# Altium footprint library ST封装.PcbLib: 1336 footprints (part 82 of 109)
Each footprint in its own frame and in the unit in brackets; x right, y up, seen from the top. Pads: shape width x height; smd on the part's side, far side on the other; paste and mask are expansions set on the pad; w line width, h text height; cw(c..) or ccw(c..) is an arc to the next point about the centre after c.
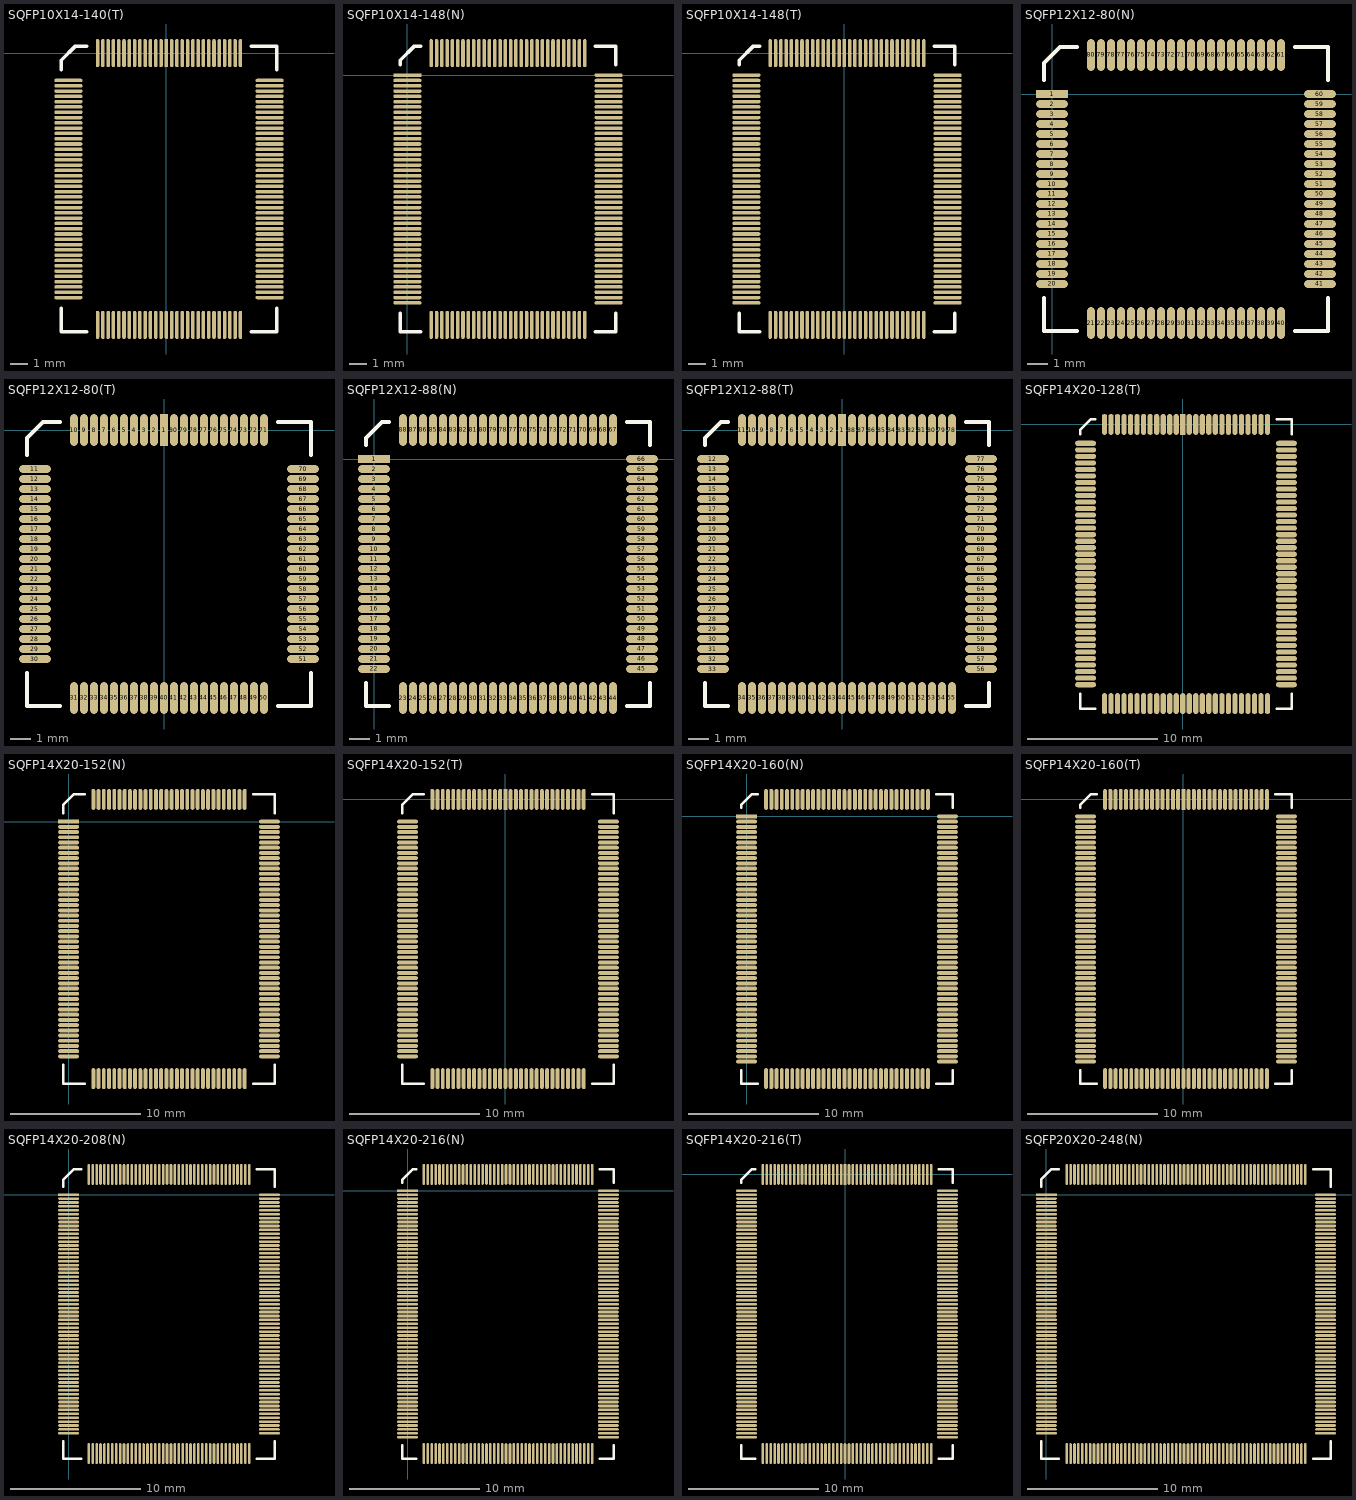
[diagram p81: the footprints below, top view; thin cyan lines are the x and y axes]

## SQFP10X14-140(T) [mm]
pads (140):
  rect 0.2x1.6 smd: 1(0,0)
  oval 0.2x1.6 smd: 2(-0.3,0) 3(-0.6,0) 4(-0.9,0) 5(-1.2,0) 6(-1.5,0) 7(-1.8,0) 8(-2.1,0) 9(-2.4,0) 10(-2.7,0) 11(-3,0) 12(-3.3,0) 13(-3.6,0) 14(-3.9,0) 57(-3.9,-15.4) 58(-3.6,-15.4) 59(-3.3,-15.4) 60(-3,-15.4) 61(-2.7,-15.4) 62(-2.4,-15.4) 63(-2.1,-15.4) 64(-1.8,-15.4) 65(-1.5,-15.4) 66(-1.2,-15.4) 67(-0.9,-15.4) 68(-0.6,-15.4) 69(-0.3,-15.4) 70(0,-15.4) 71(0.3,-15.4) 72(0.6,-15.4) 73(0.9,-15.4) 74(1.2,-15.4) 75(1.5,-15.4) 76(1.8,-15.4) 77(2.1,-15.4) 78(2.4,-15.4) 79(2.7,-15.4) 80(3,-15.4) 81(3.3,-15.4) 82(3.6,-15.4) 83(3.9,-15.4) 84(4.2,-15.4) 127(4.2,0) 128(3.9,0) 129(3.6,0) 130(3.3,0) 131(3,0) 132(2.7,0) 133(2.4,0) 134(2.1,0) 135(1.8,0) 136(1.5,0) 137(1.2,0) 138(0.9,0) 139(0.6,0) 140(0.3,0)
  oval 1.6x0.2 smd: 15(-5.55,-1.55) 16(-5.55,-1.85) 17(-5.55,-2.15) 18(-5.55,-2.45) 19(-5.55,-2.75) 20(-5.55,-3.05) 21(-5.55,-3.35) 22(-5.55,-3.65) 23(-5.55,-3.95) 24(-5.55,-4.25) 25(-5.55,-4.55) 26(-5.55,-4.85) 27(-5.55,-5.15) 28(-5.55,-5.45) 29(-5.55,-5.75) 30(-5.55,-6.05) 31(-5.55,-6.35) 32(-5.55,-6.65) 33(-5.55,-6.95) 34(-5.55,-7.25) 35(-5.55,-7.55) 36(-5.55,-7.85) 37(-5.55,-8.15) 38(-5.55,-8.45) 39(-5.55,-8.75) 40(-5.55,-9.05) 41(-5.55,-9.35) 42(-5.55,-9.65) 43(-5.55,-9.95) 44(-5.55,-10.25) 45(-5.55,-10.55) 46(-5.55,-10.85) 47(-5.55,-11.15) 48(-5.55,-11.45) 49(-5.55,-11.75) 50(-5.55,-12.05) 51(-5.55,-12.35) 52(-5.55,-12.65) 53(-5.55,-12.95) 54(-5.55,-13.25) 55(-5.55,-13.55) 56(-5.55,-13.85) 85(5.85,-13.85) 86(5.85,-13.55) 87(5.85,-13.25) 88(5.85,-12.95) 89(5.85,-12.65) 90(5.85,-12.35) 91(5.85,-12.05) 92(5.85,-11.75) 93(5.85,-11.45) 94(5.85,-11.15) 95(5.85,-10.85) 96(5.85,-10.55) 97(5.85,-10.25) 98(5.85,-9.95) 99(5.85,-9.65) 100(5.85,-9.35) 101(5.85,-9.05) 102(5.85,-8.75) 103(5.85,-8.45) 104(5.85,-8.15) 105(5.85,-7.85) 106(5.85,-7.55) 107(5.85,-7.25) 108(5.85,-6.95) 109(5.85,-6.65) 110(5.85,-6.35) 111(5.85,-6.05) 112(5.85,-5.75) 113(5.85,-5.45) 114(5.85,-5.15) 115(5.85,-4.85) 116(5.85,-4.55) 117(5.85,-4.25) 118(5.85,-3.95) 119(5.85,-3.65) 120(5.85,-3.35) 121(5.85,-3.05) 122(5.85,-2.75) 123(5.85,-2.45) 124(5.85,-2.15) 125(5.85,-1.85) 126(5.85,-1.55)
Top Overlay:
  lines w0.2: -5.95,-14.45 -5.95,-15.8 -4.5,-15.8 ; -5.95,-0.95 -5.95,-0.4 -5.15,0.4 -4.5,0.4 ; 4.8,-15.8 6.25,-15.8 6.25,-14.45 ; 4.8,0.4 6.25,0.4 6.25,-0.95

## SQFP10X14-148(N) [mm]
pads (148):
  rect 1.6x0.2 smd: 1(0,0)
  oval 1.6x0.2 smd: 2(0,-0.3) 3(0,-0.6) 4(0,-0.9) 5(0,-1.2) 6(0,-1.5) 7(0,-1.8) 8(0,-2.1) 9(0,-2.4) 10(0,-2.7) 11(0,-3) 12(0,-3.3) 13(0,-3.6) 14(0,-3.9) 15(0,-4.2) 16(0,-4.5) 17(0,-4.8) 18(0,-5.1) 19(0,-5.4) 20(0,-5.7) 21(0,-6) 22(0,-6.3) 23(0,-6.6) 24(0,-6.9) 25(0,-7.2) 26(0,-7.5) 27(0,-7.8) 28(0,-8.1) 29(0,-8.4) 30(0,-8.7) 31(0,-9) 32(0,-9.3) 33(0,-9.6) 34(0,-9.9) 35(0,-10.2) 36(0,-10.5) 37(0,-10.8) 38(0,-11.1) 39(0,-11.4) 40(0,-11.7) 41(0,-12) 42(0,-12.3) 43(0,-12.6) 44(0,-12.9) 75(11.4,-12.9) 76(11.4,-12.6) 77(11.4,-12.3) 78(11.4,-12) 79(11.4,-11.7) 80(11.4,-11.4) 81(11.4,-11.1) 82(11.4,-10.8) 83(11.4,-10.5) 84(11.4,-10.2) 85(11.4,-9.9) 86(11.4,-9.6) 87(11.4,-9.3) 88(11.4,-9) 89(11.4,-8.7) 90(11.4,-8.4) 91(11.4,-8.1) 92(11.4,-7.8) 93(11.4,-7.5) 94(11.4,-7.2) 95(11.4,-6.9) 96(11.4,-6.6) 97(11.4,-6.3) 98(11.4,-6) 99(11.4,-5.7) 100(11.4,-5.4) 101(11.4,-5.1) 102(11.4,-4.8) 103(11.4,-4.5) 104(11.4,-4.2) 105(11.4,-3.9) 106(11.4,-3.6) 107(11.4,-3.3) 108(11.4,-3) 109(11.4,-2.7) 110(11.4,-2.4) 111(11.4,-2.1) 112(11.4,-1.8) 113(11.4,-1.5) 114(11.4,-1.2) 115(11.4,-0.9) 116(11.4,-0.6) 117(11.4,-0.3) 118(11.4,0)
  oval 0.2x1.6 smd: 45(1.35,-14.15) 46(1.65,-14.15) 47(1.95,-14.15) 48(2.25,-14.15) 49(2.55,-14.15) 50(2.85,-14.15) 51(3.15,-14.15) 52(3.45,-14.15) 53(3.75,-14.15) 54(4.05,-14.15) 55(4.35,-14.15) 56(4.65,-14.15) 57(4.95,-14.15) 58(5.25,-14.15) 59(5.55,-14.15) 60(5.85,-14.15) 61(6.15,-14.15) 62(6.45,-14.15) 63(6.75,-14.15) 64(7.05,-14.15) 65(7.35,-14.15) 66(7.65,-14.15) 67(7.95,-14.15) 68(8.25,-14.15) 69(8.55,-14.15) 70(8.85,-14.15) 71(9.15,-14.15) 72(9.45,-14.15) 73(9.75,-14.15) 74(10.05,-14.15) 119(10.05,1.25) 120(9.75,1.25) 121(9.45,1.25) 122(9.15,1.25) 123(8.85,1.25) 124(8.55,1.25) 125(8.25,1.25) 126(7.95,1.25) 127(7.65,1.25) 128(7.35,1.25) 129(7.05,1.25) 130(6.75,1.25) 131(6.45,1.25) 132(6.15,1.25) 133(5.85,1.25) 134(5.55,1.25) 135(5.25,1.25) 136(4.95,1.25) 137(4.65,1.25) 138(4.35,1.25) 139(4.05,1.25) 140(3.75,1.25) 141(3.45,1.25) 142(3.15,1.25) 143(2.85,1.25) 144(2.55,1.25) 145(2.25,1.25) 146(1.95,1.25) 147(1.65,1.25) 148(1.35,1.25)
Top Overlay:
  lines w0.2: -0.4,-13.5 -0.4,-14.55 0.75,-14.55 ; -0.4,0.6 -0.4,0.85 0.4,1.65 0.75,1.65 ; 10.65,-14.55 11.8,-14.55 11.8,-13.5 ; 10.65,1.65 11.8,1.65 11.8,0.6

## SQFP10X14-148(T) [mm]
pads (148):
  rect 0.2x1.6 smd: 1(0,0)
  oval 0.2x1.6 smd: 2(-0.3,0) 3(-0.6,0) 4(-0.9,0) 5(-1.2,0) 6(-1.5,0) 7(-1.8,0) 8(-2.1,0) 9(-2.4,0) 10(-2.7,0) 11(-3,0) 12(-3.3,0) 13(-3.6,0) 14(-3.9,0) 15(-4.2,0) 60(-4.2,-15.4) 61(-3.9,-15.4) 62(-3.6,-15.4) 63(-3.3,-15.4) 64(-3,-15.4) 65(-2.7,-15.4) 66(-2.4,-15.4) 67(-2.1,-15.4) 68(-1.8,-15.4) 69(-1.5,-15.4) 70(-1.2,-15.4) 71(-0.9,-15.4) 72(-0.6,-15.4) 73(-0.3,-15.4) 74(0,-15.4) 75(0.3,-15.4) 76(0.6,-15.4) 77(0.9,-15.4) 78(1.2,-15.4) 79(1.5,-15.4) 80(1.8,-15.4) 81(2.1,-15.4) 82(2.4,-15.4) 83(2.7,-15.4) 84(3,-15.4) 85(3.3,-15.4) 86(3.6,-15.4) 87(3.9,-15.4) 88(4.2,-15.4) 89(4.5,-15.4) 134(4.5,0) 135(4.2,0) 136(3.9,0) 137(3.6,0) 138(3.3,0) 139(3,0) 140(2.7,0) 141(2.4,0) 142(2.1,0) 143(1.8,0) 144(1.5,0) 145(1.2,0) 146(0.9,0) 147(0.6,0) 148(0.3,0)
  oval 1.6x0.2 smd: 16(-5.55,-1.25) 17(-5.55,-1.55) 18(-5.55,-1.85) 19(-5.55,-2.15) 20(-5.55,-2.45) 21(-5.55,-2.75) 22(-5.55,-3.05) 23(-5.55,-3.35) 24(-5.55,-3.65) 25(-5.55,-3.95) 26(-5.55,-4.25) 27(-5.55,-4.55) 28(-5.55,-4.85) 29(-5.55,-5.15) 30(-5.55,-5.45) 31(-5.55,-5.75) 32(-5.55,-6.05) 33(-5.55,-6.35) 34(-5.55,-6.65) 35(-5.55,-6.95) 36(-5.55,-7.25) 37(-5.55,-7.55) 38(-5.55,-7.85) 39(-5.55,-8.15) 40(-5.55,-8.45) 41(-5.55,-8.75) 42(-5.55,-9.05) 43(-5.55,-9.35) 44(-5.55,-9.65) 45(-5.55,-9.95) 46(-5.55,-10.25) 47(-5.55,-10.55) 48(-5.55,-10.85) 49(-5.55,-11.15) 50(-5.55,-11.45) 51(-5.55,-11.75) 52(-5.55,-12.05) 53(-5.55,-12.35) 54(-5.55,-12.65) 55(-5.55,-12.95) 56(-5.55,-13.25) 57(-5.55,-13.55) 58(-5.55,-13.85) 59(-5.55,-14.15) 90(5.85,-14.15) 91(5.85,-13.85) 92(5.85,-13.55) 93(5.85,-13.25) 94(5.85,-12.95) 95(5.85,-12.65) 96(5.85,-12.35) 97(5.85,-12.05) 98(5.85,-11.75) 99(5.85,-11.45) 100(5.85,-11.15) 101(5.85,-10.85) 102(5.85,-10.55) 103(5.85,-10.25) 104(5.85,-9.95) 105(5.85,-9.65) 106(5.85,-9.35) 107(5.85,-9.05) 108(5.85,-8.75) 109(5.85,-8.45) 110(5.85,-8.15) 111(5.85,-7.85) 112(5.85,-7.55) 113(5.85,-7.25) 114(5.85,-6.95) 115(5.85,-6.65) 116(5.85,-6.35) 117(5.85,-6.05) 118(5.85,-5.75) 119(5.85,-5.45) 120(5.85,-5.15) 121(5.85,-4.85) 122(5.85,-4.55) 123(5.85,-4.25) 124(5.85,-3.95) 125(5.85,-3.65) 126(5.85,-3.35) 127(5.85,-3.05) 128(5.85,-2.75) 129(5.85,-2.45) 130(5.85,-2.15) 131(5.85,-1.85) 132(5.85,-1.55) 133(5.85,-1.25)
Top Overlay:
  lines w0.2: -5.95,-14.75 -5.95,-15.8 -4.8,-15.8 ; -5.95,-0.65 -5.95,-0.4 -5.15,0.4 -4.8,0.4 ; 5.1,-15.8 6.25,-15.8 6.25,-14.75 ; 5.1,0.4 6.25,0.4 6.25,-0.65

## SQFP12X12-80(N) [mm]
pads (80):
  rect 1.6x0.4 smd: 1(0,0)
  oval 1.6x0.4 smd: 2(0,-0.5) 3(0,-1) 4(0,-1.5) 5(0,-2) 6(0,-2.5) 7(0,-3) 8(0,-3.5) 9(0,-4) 10(0,-4.5) 11(0,-5) 12(0,-5.5) 13(0,-6) 14(0,-6.5) 15(0,-7) 16(0,-7.5) 17(0,-8) 18(0,-8.5) 19(0,-9) 20(0,-9.5) 41(13.4,-9.5) 42(13.4,-9) 43(13.4,-8.5) 44(13.4,-8) 45(13.4,-7.5) 46(13.4,-7) 47(13.4,-6.5) 48(13.4,-6) 49(13.4,-5.5) 50(13.4,-5) 51(13.4,-4.5) 52(13.4,-4) 53(13.4,-3.5) 54(13.4,-3) 55(13.4,-2.5) 56(13.4,-2) 57(13.4,-1.5) 58(13.4,-1) 59(13.4,-0.5) 60(13.4,0)
  oval 0.4x1.6 smd: 21(1.95,-11.45) 22(2.45,-11.45) 23(2.95,-11.45) 24(3.45,-11.45) 25(3.95,-11.45) 26(4.45,-11.45) 27(4.95,-11.45) 28(5.45,-11.45) 29(5.95,-11.45) 30(6.45,-11.45) 31(6.95,-11.45) 32(7.45,-11.45) 33(7.95,-11.45) 34(8.45,-11.45) 35(8.95,-11.45) 36(9.45,-11.45) 37(9.95,-11.45) 38(10.45,-11.45) 39(10.95,-11.45) 40(11.45,-11.45) 61(11.45,1.95) 62(10.95,1.95) 63(10.45,1.95) 64(9.95,1.95) 65(9.45,1.95) 66(8.95,1.95) 67(8.45,1.95) 68(7.95,1.95) 69(7.45,1.95) 70(6.95,1.95) 71(6.45,1.95) 72(5.95,1.95) 73(5.45,1.95) 74(4.95,1.95) 75(4.45,1.95) 76(3.95,1.95) 77(3.45,1.95) 78(2.95,1.95) 79(2.45,1.95) 80(1.95,1.95)
Top Overlay:
  lines w0.2: -0.4,-10.2 -0.4,-11.85 1.25,-11.85 ; -0.4,0.7 -0.4,1.55 0.4,2.35 1.25,2.35 ; 12.15,-11.85 13.8,-11.85 13.8,-10.2 ; 12.15,2.35 13.8,2.35 13.8,0.7

## SQFP12X12-80(T) [mm]
pads (80):
  rect 0.4x1.6 smd: 1(0,0)
  oval 0.4x1.6 smd: 2(-0.5,0) 3(-1,0) 4(-1.5,0) 5(-2,0) 6(-2.5,0) 7(-3,0) 8(-3.5,0) 9(-4,0) 10(-4.5,0) 31(-4.5,-13.4) 32(-4,-13.4) 33(-3.5,-13.4) 34(-3,-13.4) 35(-2.5,-13.4) 36(-2,-13.4) 37(-1.5,-13.4) 38(-1,-13.4) 39(-0.5,-13.4) 40(0,-13.4) 41(0.5,-13.4) 42(1,-13.4) 43(1.5,-13.4) 44(2,-13.4) 45(2.5,-13.4) 46(3,-13.4) 47(3.5,-13.4) 48(4,-13.4) 49(4.5,-13.4) 50(5,-13.4) 71(5,0) 72(4.5,0) 73(4,0) 74(3.5,0) 75(3,0) 76(2.5,0) 77(2,0) 78(1.5,0) 79(1,0) 80(0.5,0)
  oval 1.6x0.4 smd: 11(-6.45,-1.95) 12(-6.45,-2.45) 13(-6.45,-2.95) 14(-6.45,-3.45) 15(-6.45,-3.95) 16(-6.45,-4.45) 17(-6.45,-4.95) 18(-6.45,-5.45) 19(-6.45,-5.95) 20(-6.45,-6.45) 21(-6.45,-6.95) 22(-6.45,-7.45) 23(-6.45,-7.95) 24(-6.45,-8.45) 25(-6.45,-8.95) 26(-6.45,-9.45) 27(-6.45,-9.95) 28(-6.45,-10.45) 29(-6.45,-10.95) 30(-6.45,-11.45) 51(6.95,-11.45) 52(6.95,-10.95) 53(6.95,-10.45) 54(6.95,-9.95) 55(6.95,-9.45) 56(6.95,-8.95) 57(6.95,-8.45) 58(6.95,-7.95) 59(6.95,-7.45) 60(6.95,-6.95) 61(6.95,-6.45) 62(6.95,-5.95) 63(6.95,-5.45) 64(6.95,-4.95) 65(6.95,-4.45) 66(6.95,-3.95) 67(6.95,-3.45) 68(6.95,-2.95) 69(6.95,-2.45) 70(6.95,-1.95)
Top Overlay:
  lines w0.2: -6.85,-12.15 -6.85,-13.8 -5.2,-13.8 ; -6.85,-1.25 -6.85,-0.4 -6.05,0.4 -5.2,0.4 ; 5.7,-13.8 7.35,-13.8 7.35,-12.15 ; 5.7,0.4 7.35,0.4 7.35,-1.25

## SQFP12X12-88(N) [mm]
pads (88):
  rect 1.6x0.4 smd: 1(0,0)
  oval 1.6x0.4 smd: 2(0,-0.5) 3(0,-1) 4(0,-1.5) 5(0,-2) 6(0,-2.5) 7(0,-3) 8(0,-3.5) 9(0,-4) 10(0,-4.5) 11(0,-5) 12(0,-5.5) 13(0,-6) 14(0,-6.5) 15(0,-7) 16(0,-7.5) 17(0,-8) 18(0,-8.5) 19(0,-9) 20(0,-9.5) 21(0,-10) 22(0,-10.5) 45(13.4,-10.5) 46(13.4,-10) 47(13.4,-9.5) 48(13.4,-9) 49(13.4,-8.5) 50(13.4,-8) 51(13.4,-7.5) 52(13.4,-7) 53(13.4,-6.5) 54(13.4,-6) 55(13.4,-5.5) 56(13.4,-5) 57(13.4,-4.5) 58(13.4,-4) 59(13.4,-3.5) 60(13.4,-3) 61(13.4,-2.5) 62(13.4,-2) 63(13.4,-1.5) 64(13.4,-1) 65(13.4,-0.5) 66(13.4,0)
  oval 0.4x1.6 smd: 23(1.45,-11.95) 24(1.95,-11.95) 25(2.45,-11.95) 26(2.95,-11.95) 27(3.45,-11.95) 28(3.95,-11.95) 29(4.45,-11.95) 30(4.95,-11.95) 31(5.45,-11.95) 32(5.95,-11.95) 33(6.45,-11.95) 34(6.95,-11.95) 35(7.45,-11.95) 36(7.95,-11.95) 37(8.45,-11.95) 38(8.95,-11.95) 39(9.45,-11.95) 40(9.95,-11.95) 41(10.45,-11.95) 42(10.95,-11.95) 43(11.45,-11.95) 44(11.95,-11.95) 67(11.95,1.45) 68(11.45,1.45) 69(10.95,1.45) 70(10.45,1.45) 71(9.95,1.45) 72(9.45,1.45) 73(8.95,1.45) 74(8.45,1.45) 75(7.95,1.45) 76(7.45,1.45) 77(6.95,1.45) 78(6.45,1.45) 79(5.95,1.45) 80(5.45,1.45) 81(4.95,1.45) 82(4.45,1.45) 83(3.95,1.45) 84(3.45,1.45) 85(2.95,1.45) 86(2.45,1.45) 87(1.95,1.45) 88(1.45,1.45)
Top Overlay:
  lines w0.2: -0.4,-11.2 -0.4,-12.35 0.75,-12.35 ; -0.4,0.7 -0.4,1.05 0.4,1.85 0.75,1.85 ; 12.65,-12.35 13.8,-12.35 13.8,-11.2 ; 12.65,1.85 13.8,1.85 13.8,0.7

## SQFP12X12-88(T) [mm]
pads (88):
  rect 0.4x1.6 smd: 1(0,0)
  oval 0.4x1.6 smd: 2(-0.5,0) 3(-1,0) 4(-1.5,0) 5(-2,0) 6(-2.5,0) 7(-3,0) 8(-3.5,0) 9(-4,0) 10(-4.5,0) 11(-5,0) 34(-5,-13.4) 35(-4.5,-13.4) 36(-4,-13.4) 37(-3.5,-13.4) 38(-3,-13.4) 39(-2.5,-13.4) 40(-2,-13.4) 41(-1.5,-13.4) 42(-1,-13.4) 43(-0.5,-13.4) 44(0,-13.4) 45(0.5,-13.4) 46(1,-13.4) 47(1.5,-13.4) 48(2,-13.4) 49(2.5,-13.4) 50(3,-13.4) 51(3.5,-13.4) 52(4,-13.4) 53(4.5,-13.4) 54(5,-13.4) 55(5.5,-13.4) 78(5.5,0) 79(5,0) 80(4.5,0) 81(4,0) 82(3.5,0) 83(3,0) 84(2.5,0) 85(2,0) 86(1.5,0) 87(1,0) 88(0.5,0)
  oval 1.6x0.4 smd: 12(-6.45,-1.45) 13(-6.45,-1.95) 14(-6.45,-2.45) 15(-6.45,-2.95) 16(-6.45,-3.45) 17(-6.45,-3.95) 18(-6.45,-4.45) 19(-6.45,-4.95) 20(-6.45,-5.45) 21(-6.45,-5.95) 22(-6.45,-6.45) 23(-6.45,-6.95) 24(-6.45,-7.45) 25(-6.45,-7.95) 26(-6.45,-8.45) 27(-6.45,-8.95) 28(-6.45,-9.45) 29(-6.45,-9.95) 30(-6.45,-10.45) 31(-6.45,-10.95) 32(-6.45,-11.45) 33(-6.45,-11.95) 56(6.95,-11.95) 57(6.95,-11.45) 58(6.95,-10.95) 59(6.95,-10.45) 60(6.95,-9.95) 61(6.95,-9.45) 62(6.95,-8.95) 63(6.95,-8.45) 64(6.95,-7.95) 65(6.95,-7.45) 66(6.95,-6.95) 67(6.95,-6.45) 68(6.95,-5.95) 69(6.95,-5.45) 70(6.95,-4.95) 71(6.95,-4.45) 72(6.95,-3.95) 73(6.95,-3.45) 74(6.95,-2.95) 75(6.95,-2.45) 76(6.95,-1.95) 77(6.95,-1.45)
Top Overlay:
  lines w0.2: -6.85,-12.65 -6.85,-13.8 -5.7,-13.8 ; -6.85,-0.75 -6.85,-0.4 -6.05,0.4 -5.7,0.4 ; 6.2,-13.8 7.35,-13.8 7.35,-12.65 ; 6.2,0.4 7.35,0.4 7.35,-0.75

## SQFP14X20-128(T) [mm]
pads (128):
  rect 0.4x1.6 smd: 1(0,0)
  oval 0.4x1.6 smd: 2(-0.5,0) 3(-1,0) 4(-1.5,0) 5(-2,0) 6(-2.5,0) 7(-3,0) 8(-3.5,0) 9(-4,0) 10(-4.5,0) 11(-5,0) 12(-5.5,0) 13(-6,0) 52(-6,-21.4) 53(-5.5,-21.4) 54(-5,-21.4) 55(-4.5,-21.4) 56(-4,-21.4) 57(-3.5,-21.4) 58(-3,-21.4) 59(-2.5,-21.4) 60(-2,-21.4) 61(-1.5,-21.4) 62(-1,-21.4) 63(-0.5,-21.4) 64(0,-21.4) 65(0.5,-21.4) 66(1,-21.4) 67(1.5,-21.4) 68(2,-21.4) 69(2.5,-21.4) 70(3,-21.4) 71(3.5,-21.4) 72(4,-21.4) 73(4.5,-21.4) 74(5,-21.4) 75(5.5,-21.4) 76(6,-21.4) 77(6.5,-21.4) 116(6.5,0) 117(6,0) 118(5.5,0) 119(5,0) 120(4.5,0) 121(4,0) 122(3.5,0) 123(3,0) 124(2.5,0) 125(2,0) 126(1.5,0) 127(1,0) 128(0.5,0)
  oval 1.6x0.4 smd: 14(-7.45,-1.45) 15(-7.45,-1.95) 16(-7.45,-2.45) 17(-7.45,-2.95) 18(-7.45,-3.45) 19(-7.45,-3.95) 20(-7.45,-4.45) 21(-7.45,-4.95) 22(-7.45,-5.45) 23(-7.45,-5.95) 24(-7.45,-6.45) 25(-7.45,-6.95) 26(-7.45,-7.45) 27(-7.45,-7.95) 28(-7.45,-8.45) 29(-7.45,-8.95) 30(-7.45,-9.45) 31(-7.45,-9.95) 32(-7.45,-10.45) 33(-7.45,-10.95) 34(-7.45,-11.45) 35(-7.45,-11.95) 36(-7.45,-12.45) 37(-7.45,-12.95) 38(-7.45,-13.45) 39(-7.45,-13.95) 40(-7.45,-14.45) 41(-7.45,-14.95) 42(-7.45,-15.45) 43(-7.45,-15.95) 44(-7.45,-16.45) 45(-7.45,-16.95) 46(-7.45,-17.45) 47(-7.45,-17.95) 48(-7.45,-18.45) 49(-7.45,-18.95) 50(-7.45,-19.45) 51(-7.45,-19.95) 78(7.95,-19.95) 79(7.95,-19.45) 80(7.95,-18.95) 81(7.95,-18.45) 82(7.95,-17.95) 83(7.95,-17.45) 84(7.95,-16.95) 85(7.95,-16.45) 86(7.95,-15.95) 87(7.95,-15.45) 88(7.95,-14.95) 89(7.95,-14.45) 90(7.95,-13.95) 91(7.95,-13.45) 92(7.95,-12.95) 93(7.95,-12.45) 94(7.95,-11.95) 95(7.95,-11.45) 96(7.95,-10.95) 97(7.95,-10.45) 98(7.95,-9.95) 99(7.95,-9.45) 100(7.95,-8.95) 101(7.95,-8.45) 102(7.95,-7.95) 103(7.95,-7.45) 104(7.95,-6.95) 105(7.95,-6.45) 106(7.95,-5.95) 107(7.95,-5.45) 108(7.95,-4.95) 109(7.95,-4.45) 110(7.95,-3.95) 111(7.95,-3.45) 112(7.95,-2.95) 113(7.95,-2.45) 114(7.95,-1.95) 115(7.95,-1.45)
Top Overlay:
  lines w0.2: -7.85,-20.65 -7.85,-21.8 -6.7,-21.8 ; -7.85,-0.75 -7.85,-0.4 -7.05,0.4 -6.7,0.4 ; 7.2,-21.8 8.35,-21.8 8.35,-20.65 ; 7.2,0.4 8.35,0.4 8.35,-0.75

## SQFP14X20-152(N) [mm]
pads (152):
  rect 1.6x0.3 smd: 1(0,0)
  oval 1.6x0.3 smd: 2(0,-0.4) 3(0,-0.8) 4(0,-1.2) 5(0,-1.6) 6(0,-2) 7(0,-2.4) 8(0,-2.8) 9(0,-3.2) 10(0,-3.6) 11(0,-4) 12(0,-4.4) 13(0,-4.8) 14(0,-5.2) 15(0,-5.6) 16(0,-6) 17(0,-6.4) 18(0,-6.8) 19(0,-7.2) 20(0,-7.6) 21(0,-8) 22(0,-8.4) 23(0,-8.8) 24(0,-9.2) 25(0,-9.6) 26(0,-10) 27(0,-10.4) 28(0,-10.8) 29(0,-11.2) 30(0,-11.6) 31(0,-12) 32(0,-12.4) 33(0,-12.8) 34(0,-13.2) 35(0,-13.6) 36(0,-14) 37(0,-14.4) 38(0,-14.8) 39(0,-15.2) 40(0,-15.6) 41(0,-16) 42(0,-16.4) 43(0,-16.8) 44(0,-17.2) 45(0,-17.6) 46(0,-18) 77(15.4,-18) 78(15.4,-17.6) 79(15.4,-17.2) 80(15.4,-16.8) 81(15.4,-16.4) 82(15.4,-16) 83(15.4,-15.6) 84(15.4,-15.2) 85(15.4,-14.8) 86(15.4,-14.4) 87(15.4,-14) 88(15.4,-13.6) 89(15.4,-13.2) 90(15.4,-12.8) 91(15.4,-12.4) 92(15.4,-12) 93(15.4,-11.6) 94(15.4,-11.2) 95(15.4,-10.8) 96(15.4,-10.4) 97(15.4,-10) 98(15.4,-9.6) 99(15.4,-9.2) 100(15.4,-8.8) 101(15.4,-8.4) 102(15.4,-8) 103(15.4,-7.6) 104(15.4,-7.2) 105(15.4,-6.8) 106(15.4,-6.4) 107(15.4,-6) 108(15.4,-5.6) 109(15.4,-5.2) 110(15.4,-4.8) 111(15.4,-4.4) 112(15.4,-4) 113(15.4,-3.6) 114(15.4,-3.2) 115(15.4,-2.8) 116(15.4,-2.4) 117(15.4,-2) 118(15.4,-1.6) 119(15.4,-1.2) 120(15.4,-0.8) 121(15.4,-0.4) 122(15.4,0)
  oval 0.3x1.6 smd: 47(1.9,-19.7) 48(2.3,-19.7) 49(2.7,-19.7) 50(3.1,-19.7) 51(3.5,-19.7) 52(3.9,-19.7) 53(4.3,-19.7) 54(4.7,-19.7) 55(5.1,-19.7) 56(5.5,-19.7) 57(5.9,-19.7) 58(6.3,-19.7) 59(6.7,-19.7) 60(7.1,-19.7) 61(7.5,-19.7) 62(7.9,-19.7) 63(8.3,-19.7) 64(8.7,-19.7) 65(9.1,-19.7) 66(9.5,-19.7) 67(9.9,-19.7) 68(10.3,-19.7) 69(10.7,-19.7) 70(11.1,-19.7) 71(11.5,-19.7) 72(11.9,-19.7) 73(12.3,-19.7) 74(12.7,-19.7) 75(13.1,-19.7) 76(13.5,-19.7) 123(13.5,1.7) 124(13.1,1.7) 125(12.7,1.7) 126(12.3,1.7) 127(11.9,1.7) 128(11.5,1.7) 129(11.1,1.7) 130(10.7,1.7) 131(10.3,1.7) 132(9.9,1.7) 133(9.5,1.7) 134(9.1,1.7) 135(8.7,1.7) 136(8.3,1.7) 137(7.9,1.7) 138(7.5,1.7) 139(7.1,1.7) 140(6.7,1.7) 141(6.3,1.7) 142(5.9,1.7) 143(5.5,1.7) 144(5.1,1.7) 145(4.7,1.7) 146(4.3,1.7) 147(3.9,1.7) 148(3.5,1.7) 149(3.1,1.7) 150(2.7,1.7) 151(2.3,1.7) 152(1.9,1.7)
Top Overlay:
  lines w0.2: -0.4,-18.65 -0.4,-20.1 1.25,-20.1 ; -0.4,0.65 -0.4,1.3 0.4,2.1 1.25,2.1 ; 14.15,-20.1 15.8,-20.1 15.8,-18.65 ; 14.15,2.1 15.8,2.1 15.8,0.65
